# Altium footprint library connectors.PCBLIB: 188 footprints (part 6 of 12)
Each footprint in its own frame and in the unit in brackets; x right, y up, seen from the top. Pads: shape width x height; smd on the part's side, far side on the other; paste and mask are expansions set on the pad; w line width, h text height; cw(c..) or ccw(c..) is an arc to the next point about the centre after c.
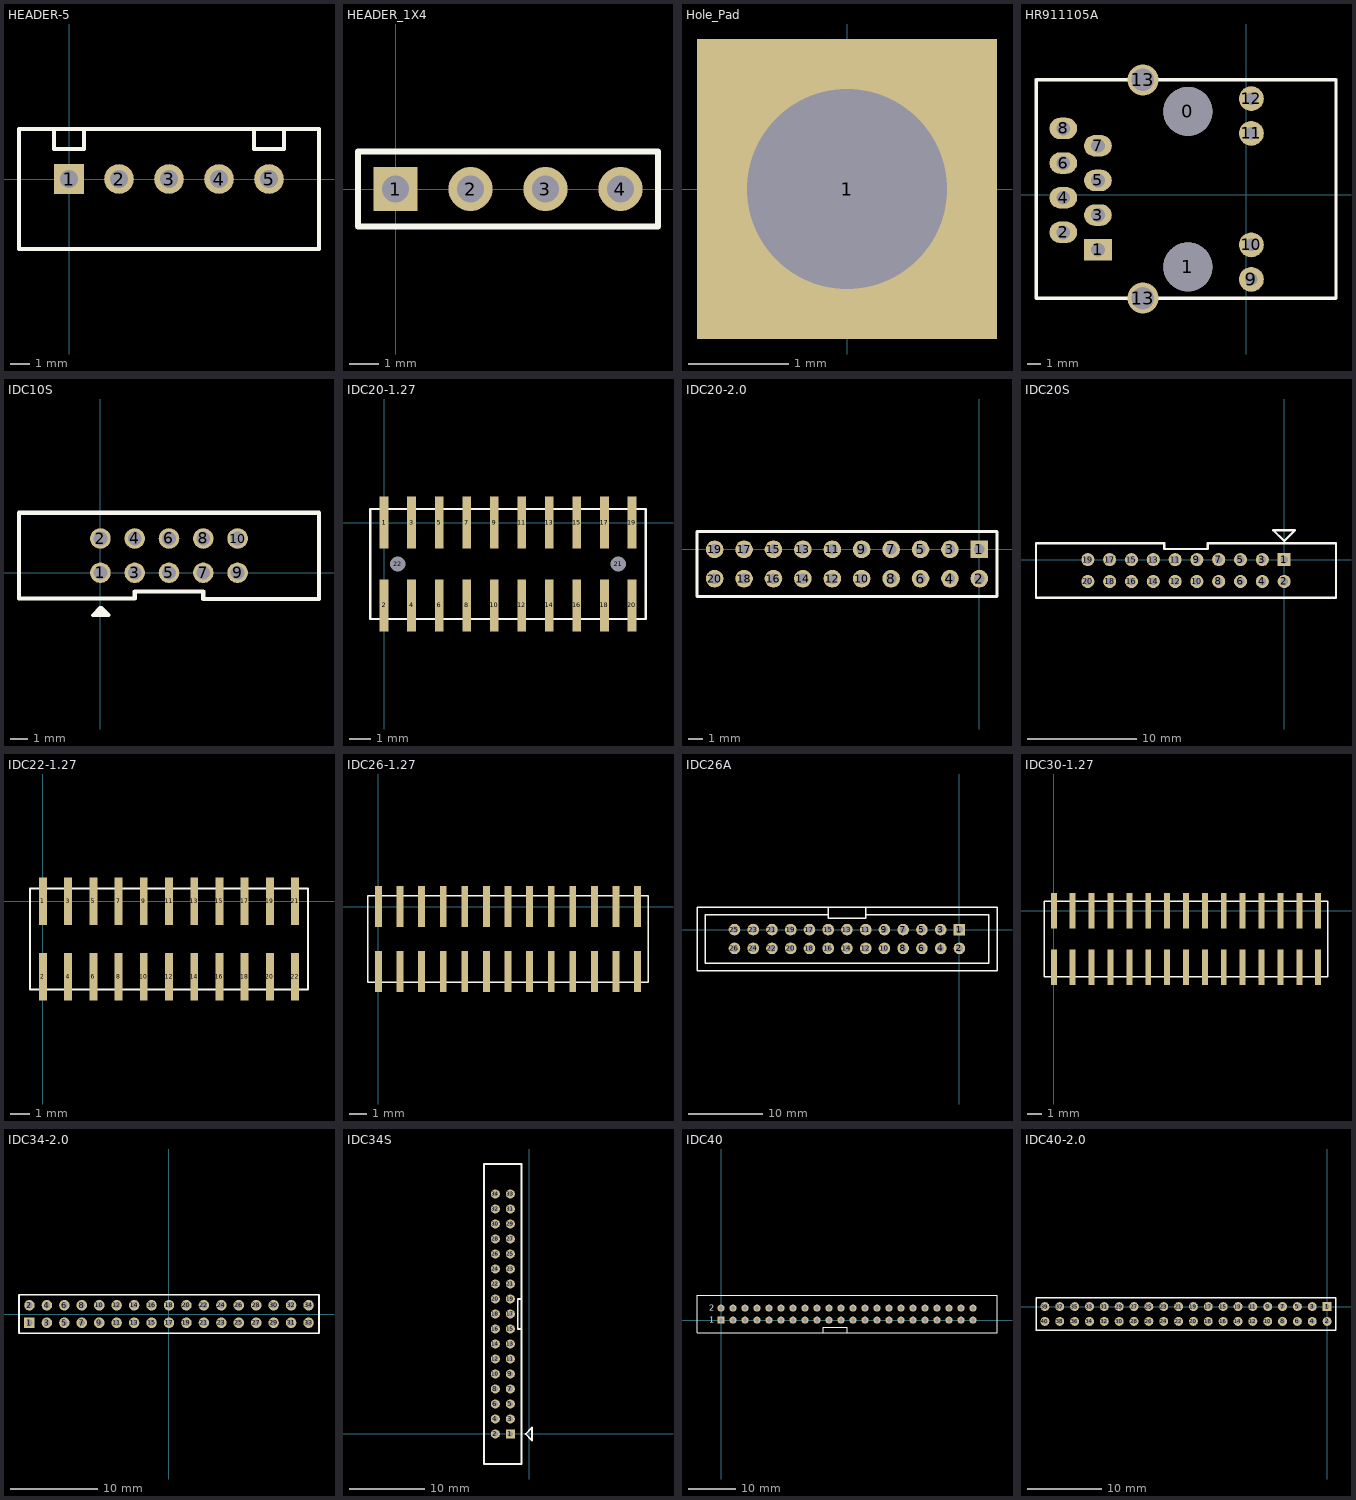
[diagram p5: the footprints below, top view; thin cyan lines are the x and y axes]

## HEADER-5 [mm]
pads (5):
  rect 1.5x1.5 hole 0.9: 1(0,0)
  round 1.5 hole 0.9: 2(2.54,0) 3(5.08,0) 4(7.62,0) 5(10.16,0)
Top Overlay:
  lines w0.2: -0.762,2.54 -0.762,1.524 0.762,1.524 0.762,2.54 ; 9.398,2.54 9.398,1.524 10.922,1.524 10.922,2.54 ; -2.54,-3.556 12.7,-3.556 12.7,2.54 -2.54,2.54 -2.54,-3.556

## HEADER_1X4 [mm]
pads (4):
  rect 1.5x1.5 hole 0.9: 1(0,0)
  round 1.5 hole 0.9: 2(2.54,0) 3(5.08,0) 4(7.62,0)
Top Overlay:
  lines w0.2: -1.27,-1.27 8.89,-1.27 8.89,1.27 -1.27,1.27 -1.27,-1.27

## Hole_Pad [mm]
pads (1):
  rect 3x3 hole 2: 1(0,0)

## HR911105A [mil] "HR911105A"
pads (16):
  round 141.6 hole 141.6: 0(-169.29,240.16) 1(-169.29,-208.66)
  rect 80x62 hole 40: 1(-429,-159)
  oval 80x62 hole 40: 2(-529,-109) 3(-429,-59) 4(-529,-9) 5(-429,41) 6(-529,91) 7(-429,141) 8(-529,191)
  round 72 hole 36: 9(13.91,-244.63) 10(13.91,-145) 11(13.91,176.87) 12(13.91,277)
  round 90 hole 65: 13(-299.08,-298.76) 13(-299.08,331.16)
Top Overlay:
  lines w10: -607.74,-299 -607.5,-298.76 ; -607.74,331 -607.58,331.16 ; -607.58,331.16 -299.08,331.16 258.24,331.16 258.4,331 258.4,-299 258.17,-298.76 -299.08,-298.76 -607.5,-298.76 ; -607.58,331.16 -607.58,-298.69 -607.5,-298.76

## IDC10S [mm]
pads (10):
  round 1.2 hole 0.8: 1(-0.001,0.003) 2(-0.001,2.003) 3(1.999,0.003) 4(1.999,2.003) 5(3.999,0.003) 6(3.999,2.003) 7(5.999,0.003) 8(5.999,2.003) 9(7.999,0.003) 10(7.999,2.003)
Top Overlay:
  lines w0.2: 0.311,-2.284 -0.236,-2.284 -0.249,-2.271 0.105,-2.271 0.201,-2.174 0.201,-2.245 -0.026,-2.472 -0.026,-2.047 -0.001,-2.022 ; -0.001,-2.022 -0.451,-2.472 0.299,-2.472 0.499,-2.472 0.049,-2.022 -0.001,-2.022
  lines w0.254: 12.749,-1.522 5.999,-1.522 5.999,-1.093 1.999,-1.093 1.999,-1.497 -4.751,-1.497 -4.751,3.503 12.749,3.503 12.749,-1.497

## IDC20-1.27 [mm]
pads (22):
  rect 0.4x2.4 smd: 1(0,0) 2(0,-3.81) 3(1.27,0) 4(1.27,-3.81) 5(2.54,0) 6(2.54,-3.81) 7(3.81,0) 8(3.81,-3.81) 9(5.08,0) 10(5.08,-3.81) 11(6.35,0) 12(6.35,-3.81) 13(7.62,0) 14(7.62,-3.81) 15(8.89,0) 16(8.89,-3.81) 17(10.16,0) 18(10.16,-3.81) 19(11.43,0) 20(11.43,-3.81)
  round 0.5 hole 0.7: 21(10.795,-1.905) 22(0.635,-1.905)
Top Overlay:
  lines w0.1: -0.635,-4.445 12.065,-4.445 12.065,0.635 -0.635,0.635 -0.635,-4.445

## IDC20-2.0 [mm]
pads (20):
  rect 1.2x1.2 hole 0.7: 1(0,0)
  round 1.2 hole 0.7: 2(0,-2) 3(-2,0) 4(-2,-2) 5(-4,0) 6(-4,-2) 7(-6,0) 8(-6,-2) 9(-8,0) 10(-8,-2) 11(-10,0) 12(-10,-2) 13(-12,0) 14(-12,-2) 15(-14,0) 16(-14,-2) 17(-16,0) 18(-16,-2) 19(-18,0) 20(-18,-2)
Top Overlay:
  lines w0.2: -19.2,-3.2 -19.2,1.2 -7.3,1.2 1.2,1.2 1.2,-3.2 -19.2,-3.2

## IDC20S [mm]
pads (20):
  rect 1.2x1.2 hole 0.7: 1(-0.008,0.023)
  round 1.2 hole 0.7: 2(-0.008,-1.977) 3(-2.008,0.023) 4(-2.008,-1.977) 5(-4.008,0.023) 6(-4.008,-1.977) 7(-6.008,0.023) 8(-6.008,-1.977) 9(-8.008,0.023) 10(-8.008,-1.977) 11(-10.008,0.023) 12(-10.008,-1.977) 13(-12.008,0.023) 14(-12.008,-1.977) 15(-14.008,0.023) 16(-14.008,-1.977) 17(-16.008,0.023) 18(-16.008,-1.977) 19(-18.008,0.023) 20(-18.008,-1.977)
Top Overlay:
  lines w0.2: -22.758,-3.477 -22.758,1.523 -11.008,1.523 -11.008,0.998 -7.008,0.998 -7.008,1.523 4.742,1.523 4.742,-3.477 -22.758,-3.477 ; -1.008,2.723 -0.008,1.723 0.992,2.723 -1.008,2.723

## IDC22-1.27 [mm]
pads (22):
  rect 0.4x2.4 smd: 1(0,0) 2(0,-3.81) 3(1.27,0) 4(1.27,-3.81) 5(2.54,0) 6(2.54,-3.81) 7(3.81,0) 8(3.81,-3.81) 9(5.08,0) 10(5.08,-3.81) 11(6.35,0) 12(6.35,-3.81) 13(7.62,0) 14(7.62,-3.81) 15(8.89,0) 16(8.89,-3.81) 17(10.16,0) 18(10.16,-3.81) 19(11.43,0) 20(11.43,-3.81) 21(12.7,0) 22(12.7,-3.81)
Top Overlay:
  lines w0.1: -0.635,-4.445 13.335,-4.445 13.335,0.635 -0.635,0.635 -0.635,-4.445

## IDC26-1.27 [mm]
pads (26):
  rect 0.4x2.4 smd: 1(0,0) 2(0,-3.81) 3(1.27,0) 4(1.27,-3.81) 5(2.54,0) 6(2.54,-3.81) 7(3.81,0) 8(3.81,-3.81) 9(5.08,0) 10(5.08,-3.81) 11(6.35,0) 12(6.35,-3.81) 13(7.62,0) 14(7.62,-3.81) 15(8.89,0) 16(8.89,-3.81) 17(10.16,0) 18(10.16,-3.81) 19(11.43,0) 20(11.43,-3.81) 21(12.7,0) 22(12.7,-3.81) 23(13.97,0) 24(13.97,-3.81) 25(15.24,0) 26(15.24,-3.81)
Top Overlay:
  lines w0.1: -0.635,-4.445 -0.635,0.635 15.875,0.635 15.875,-4.445 -0.635,-4.445

## IDC26A [mil]
pads (26):
  rect 62x62 hole 37: 1(0,0)
  round 62 hole 37: 2(0,-100) 3(-100,0) 4(-100,-100) 5(-200,0) 6(-200,-100) 7(-300,0) 8(-300,-100) 9(-400,0) 10(-400,-100) 11(-500,0) 12(-500,-100) 13(-600,0) 14(-600,-100) 15(-700,0) 16(-700,-100) 17(-800,0) 18(-800,-100) 19(-900,0) 20(-900,-100) 21(-1000,0) 22(-1000,-100) 23(-1100,0) 24(-1100,-100) 25(-1200,0) 26(-1200,-100)
Top Overlay:
  lines w8: -700,79.92 -1355,79.92 -1355,-179.92 156.3,-179.92 156.3,79.92 -500,79.92 ; -700,118.69 -700,60.6 -500,60.6 -500,119.29 ; -1400,-219.29 -1400,119.29 200.59,119.29 200.59,-219.29 -1400,-219.29

## IDC30-1.27 [mm]
pads (30):
  rect 0.4x2.4 smd: 1(0,0) 2(0,-3.81) 3(1.27,0) 4(1.27,-3.81) 5(2.54,0) 6(2.54,-3.81) 7(3.81,0) 8(3.81,-3.81) 9(5.08,0) 10(5.08,-3.81) 11(6.35,0) 12(6.35,-3.81) 13(7.62,0) 14(7.62,-3.81) 15(8.89,0) 16(8.89,-3.81) 17(10.16,0) 18(10.16,-3.81) 19(11.43,0) 20(11.43,-3.81) 21(12.7,0) 22(12.7,-3.81) 23(13.97,0) 24(13.97,-3.81) 25(15.24,0) 26(15.24,-3.81) 27(16.51,0) 28(16.51,-3.81) 29(17.78,0) 30(17.78,-3.81)
Top Overlay:
  lines w0.1: -0.635,-4.445 -0.635,0.635 18.415,0.635 18.415,-4.445 -0.635,-4.445

## IDC34-2.0 [mm]
pads (34):
  rect 1.2x1.2 hole 0.7: 1(-16,-1)
  round 1.2 hole 0.7: 2(-16,1) 3(-14,-1) 4(-14,1) 5(-12,-1) 6(-12,1) 7(-10,-1) 8(-10,1) 9(-8,-1) 10(-8,1) 11(-6,-1) 12(-6,1) 13(-4,-1) 14(-4,1) 15(-2,-1) 16(-2,1) 17(0,-1) 18(0,1) 19(2,-1) 20(2,1) 21(4,-1) 22(4,1) 23(6,-1) 24(6,1) 25(8,-1) 26(8,1) 27(10,-1) 28(10,1) 29(12,-1) 30(12,1) 31(14,-1) 32(14,1) 33(16,-1) 34(16,1)
Top Overlay:
  lines w0.2: -17.2,-2.2 17.2,-2.2 17.2,2.2 -17.2,2.2 -17.2,-2.2

## IDC34S [mm]
pads (34):
  rect 1.2x1.2 hole 0.7: 1(-2.506,0.004)
  round 1.2 hole 0.7: 2(-4.506,0.004) 3(-2.506,2.004) 4(-4.506,2.004) 5(-2.506,4.004) 6(-4.506,4.004) 7(-2.506,6.004) 8(-4.506,6.004) 9(-2.506,8.004) 10(-4.506,8.004) 11(-2.506,10.004) 12(-4.506,10.004) 13(-2.506,12.004) 14(-4.506,12.004) 15(-2.506,14.004) 16(-4.506,14.004) 17(-2.506,16.004) 18(-4.506,16.004) 19(-2.506,18.004) 20(-4.506,18.004) 21(-2.506,20.004) 22(-4.506,20.004) 23(-2.506,22.004) 24(-4.506,22.004) 25(-2.506,24.004) 26(-4.506,24.004) 27(-2.506,26.004) 28(-4.506,26.004) 29(-2.506,28.004) 30(-4.506,28.004) 31(-2.506,30.004) 32(-4.506,30.004) 33(-2.506,32.004) 34(-4.506,32.004)
Top Overlay:
  lines w0.254: -6.007,-4.003 -1.007,-4.003 ; -6.006,-4.003 -6.006,35.997 -1.006,35.997 -1.006,-4.003 ; -1.006,13.996 -1.514,13.996 -1.514,17.996 -1.006,17.996 ; -0.482,-0.003 0.368,-0.853 0.368,0.847 -0.482,-0.003

## IDC40 [mm] "Connector; Header; 20x2 Position"
height 3.5
pads (44):
  rect 1.5x1.5 hole 0.9: 1(0,0)
  round 1.5 hole 0.9: 2(0,2.54) 3(2.54,0) 4(2.54,2.54) 5(5.08,0) 6(5.08,2.54) 7(7.62,0) 8(7.62,2.54) 9(10.16,0) 10(10.16,2.54) 11(12.7,0) 12(12.7,2.54) 13(15.24,0) 14(15.24,2.54) 15(17.78,0) 16(17.78,2.54) 17(20.32,0) 18(20.32,2.54) 19(22.86,0) 20(22.86,2.54) 21(25.4,0) 22(25.4,2.54) 23(27.94,0) 24(27.94,2.54) 25(30.48,0) 26(30.48,2.54) 27(33.02,0) 28(33.02,2.54) 29(35.56,0) 30(35.56,2.54) 31(38.1,0) 32(38.1,2.54) 33(40.64,0) 34(40.64,2.54) 35(43.18,0) 36(43.18,2.54) 37(45.72,0) 38(45.72,2.54) 39(48.26,0) 40(48.26,2.54) 41(50.8,0) 42(50.8,2.54) 43(53.34,0) 44(53.34,2.54)
Top Overlay:
  lines w0.2: -5.08,-2.7 -5.08,5.3 53.3,5.3 58.42,5.3 58.42,-2.7 53.3,-2.7 -5.08,-2.7
  lines w0.203: 21.6,-2.7 21.6,-1.5 26.7,-1.5 26.7,-2.7
  text "2" at -2.54,2.032 h1.27
  text "1" at -2.54,-0.508 h1.27

## IDC40-2.0 [mm]
pads (40):
  rect 1.2x1.2 hole 0.7: 1(0,0)
  round 1.2 hole 0.7: 2(0,-2) 3(-2,0) 4(-2,-2) 5(-4,0) 6(-4,-2) 7(-6,0) 8(-6,-2) 9(-8,0) 10(-8,-2) 11(-10,0) 12(-10,-2) 13(-12,0) 14(-12,-2) 15(-14,0) 16(-14,-2) 17(-16,0) 18(-16,-2) 19(-18,0) 20(-18,-2) 21(-20,0) 22(-20,-2) 23(-22,0) 24(-22,-2) 25(-24,0) 26(-24,-2) 27(-26,0) 28(-26,-2) 29(-28,0) 30(-28,-2) 31(-30,0) 32(-30,-2) 33(-32,0) 34(-32,-2) 35(-34,0) 36(-34,-2) 37(-36,0) 38(-36,-2) 39(-38,0) 40(-38,-2)
Top Overlay:
  lines w0.2: -39.2,-3.2 1.2,-3.2 1.2,1.2 -39.2,1.2 -39.2,-3.2